# Altium footprint library Pasivos.PcbLib: 138 footprints (part 1 of 9)
Each footprint in its own frame and in the unit in brackets; x right, y up, seen from the top. Pads: shape width x height; smd on the part's side, far side on the other; paste and mask are expansions set on the pad; w line width, h text height; cw(c..) or ccw(c..) is an arc to the next point about the centre after c.
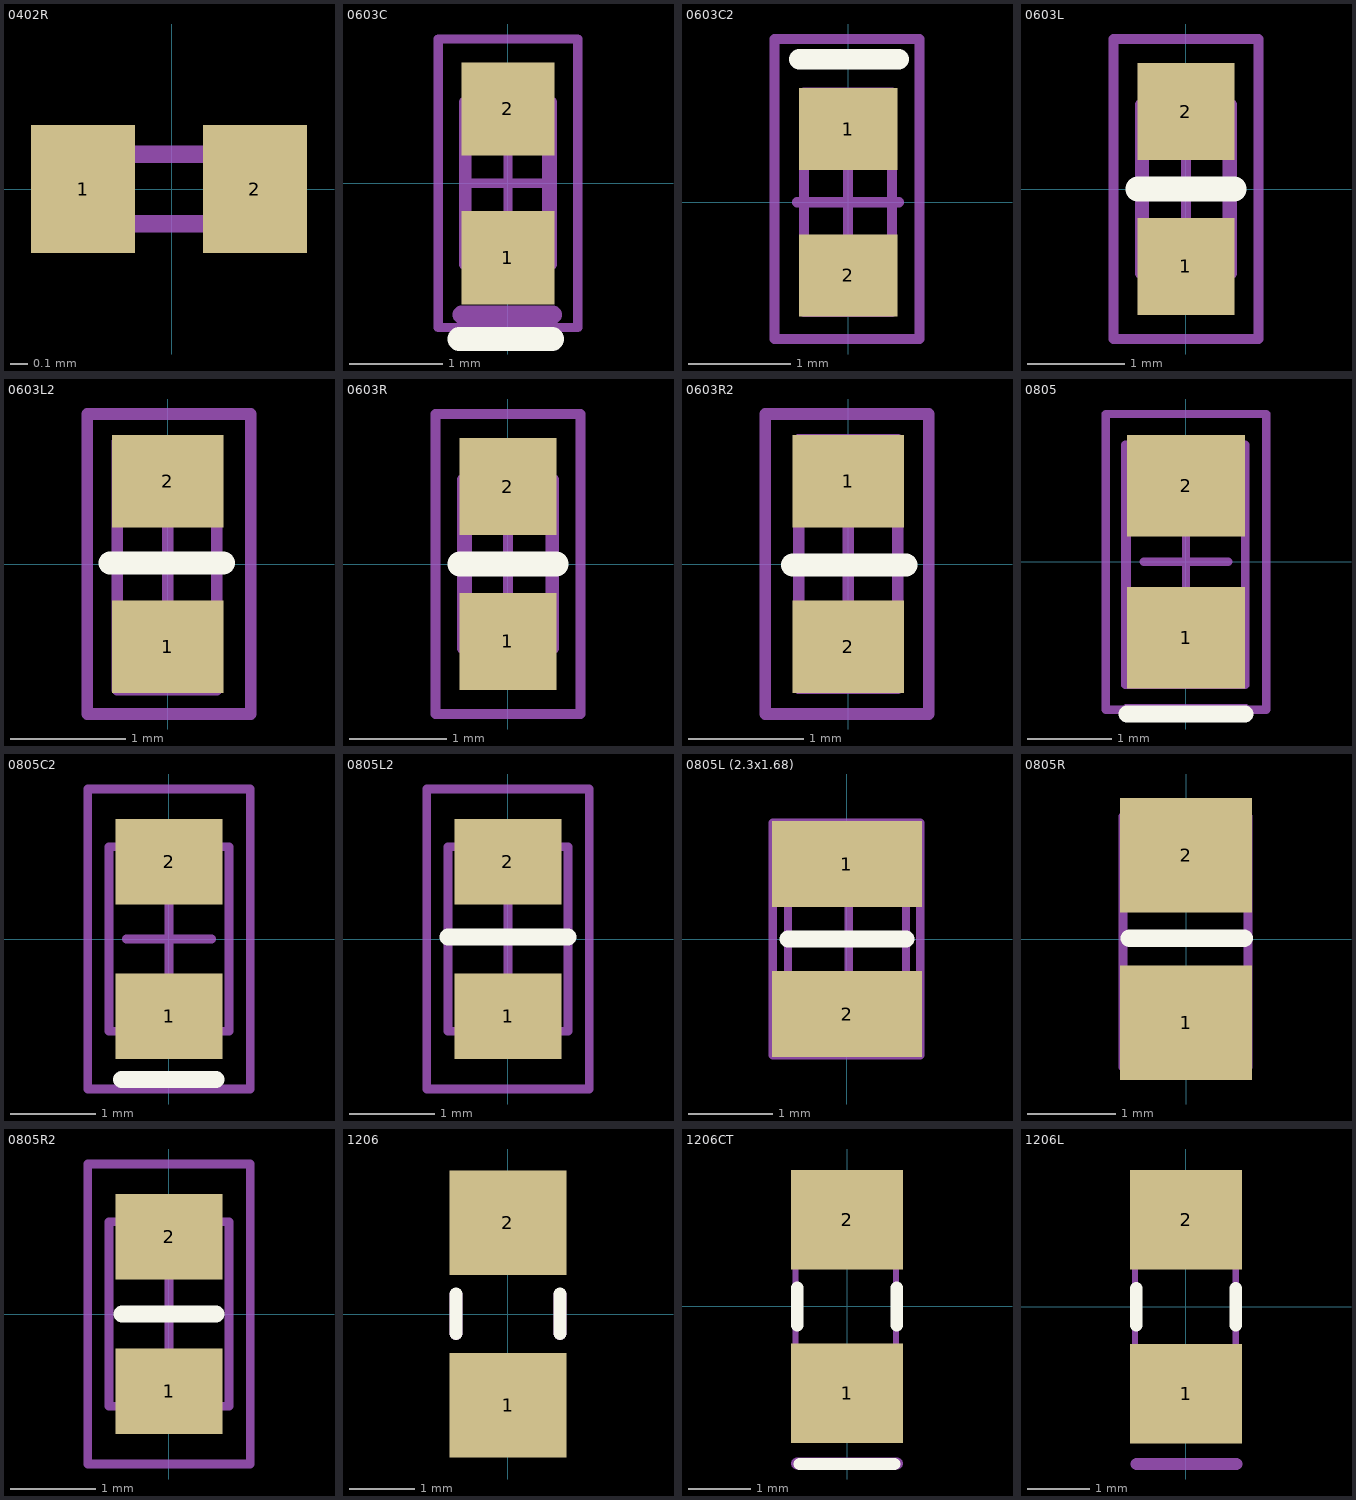
[diagram p0: the footprints below, top view; thin cyan lines are the x and y axes]

## 0402R [mm]
pads (2):
  rect 0.6x0.74 smd: 1(-0.51,0) 2(0.48,0)
Mechanical 16:
  rectangle: 0.225,-0.25 0.5,0.25
  rectangle: -0.501,-0.25 -0.226,0.25
  lines w0.102: -0.425,-0.2 0.425,-0.2 ; -0.425,0.2 0.425,0.2
3D body "0402R.step": height 0.34, standoff 0, extent -0.54,-0.3 0.5,0.3

## 0603C [mm]
pads (2):
  rect 1x1 smd: 1(0,-0.8) 2(0,0.8)
Top Overlay:
  lines w0.254: -0.524,-1.673 0.476,-1.673
Mechanical 13:
  lines w0.1: -0.475,-0.875 -0.475,0.875 0.475,0.875 0.475,-0.875 -0.475,-0.875
Mechanical 15:
  lines w0.1: -0.475,0 0.475,0 ; 0,-0.475 0,0.475 ; -0.75,-1.55 -0.75,1.55 0.75,1.55 0.75,-1.55 -0.75,-1.55
Mechanical 29:
  lines w0.1: -0.442,-1.076 -0.442,1.074 0.418,1.074 0.418,-1.076 -0.442,-1.076
  lines w0.2: -0.498,-1.411 0.482,-1.411
  text "'.Designator'" at 0.255,-0.949 h0.5
3D body "0603 SMD Capacitor.step": height 0.3, standoff 0, extent -0.4,-0.8 0.4,0.8

## 0603C2 [mm]
pads (2):
  rect 0.965x0.8 smd: 1(0,0.717) 2(0,-0.717)
Top Overlay:
  lines w0.2: -0.48,1.4 0.5,1.4
Mechanical 13:
  lines w0.1: -0.43,-1.075 -0.43,1.075 0.43,1.075 0.43,-1.075 -0.43,-1.075
Mechanical 15:
  lines w0.1: -0.5,0 0.5,0 ; 0,-0.5 0,0.5 ; -0.72,-1.34 0.7,-1.34 0.7,1.6 -0.72,1.6 -0.72,-1.34
3D body "0603 SMD Capacitor.step": height 0.3, standoff 0, extent -0.39,-0.8 0.41,0.8

## 0603L [mm] "1.60mm x 0.80mm"
pads (2):
  rect 1x1 smd: 1(0,-0.8) 2(0,0.8)
Top Overlay:
  lines w0.254: -0.5,0 0.5,0
Mechanical 13:
  lines w0.1: -0.475,-0.875 0.475,-0.875 0.475,0.875 -0.475,0.875 -0.475,-0.875
Mechanical 15:
  lines w0.1: -0.475,0 0.475,0 ; 0,-0.475 0,0.475 ; -0.75,-1.55 0.75,-1.55 0.75,1.55 -0.75,1.55 -0.75,-1.55
Mechanical 29:
  lines w0.1: -0.434,-1.075 0.426,-1.075 0.426,1.075 -0.434,1.075 -0.434,-1.075
  text "'.Designator'" at 0.291,-0.903 h0.5
3D body "0603L.step": height 0.78, standoff -0.01, extent -0.475,-0.8 0.475,0.8

## 0603L2 [mm] "1.60mm x 0.80mm"
pads (2):
  rect 0.965x0.8 smd: 1(0,-0.717) 2(0,0.718)
Top Overlay:
  lines w0.2: -0.5,0.01 0.48,0.01
Mechanical 13:
  lines w0.1: -0.437,-1.09 0.423,-1.09 0.423,1.06 -0.437,1.06 -0.437,-1.09
Mechanical 15:
  lines w0.1: -0.5,0 0.5,0 ; 0,-0.5 0,0.5 ; -0.7,-1.3 -0.7,1.3 0.72,1.3 0.72,-1.3 -0.7,-1.3
3D body "0603L.step": height 0.78, standoff -0.01, extent -0.47,-0.79 0.48,0.81

## 0603R [mm] "1.60mm x 0.80mm"
pads (2):
  rect 1x1 smd: 1(0,-0.8) 2(0,0.8)
Top Overlay:
  lines w0.254: -0.5,0 0.5,0
Mechanical 13:
  lines w0.1: -0.475,-0.875 0.475,-0.875 0.475,0.875 -0.475,0.875 -0.475,-0.875
Mechanical 15:
  lines w0.1: -0.475,0 0.475,0 ; 0,-0.475 0,0.475 ; -0.75,-1.55 0.75,-1.55 0.75,1.55 -0.75,1.55 -0.75,-1.55
Mechanical 29:
  lines w0.1: -0.424,-1.086 0.436,-1.086 0.436,1.064 -0.424,1.064 -0.424,-1.086
  text "'.Designator'" at 0.279,-0.908 h0.5
3D body "RES0603.STEP": height 0.45, standoff -0.01, extent -0.4,-0.8 0.4,0.8

## 0603R2 [mm] "1.60mm x 0.80mm"
pads (2):
  rect 0.965x0.8 smd: 1(0,0.718) 2(0,-0.717)
Top Overlay:
  lines w0.2: -0.48,-0.01 0.5,-0.01
Mechanical 13:
  lines w0.1: -0.43,-1.075 0.43,-1.075 0.43,1.075 -0.43,1.075 -0.43,-1.075
Mechanical 15:
  lines w0.1: -0.191,-0.022 0.157,-0.022 ; 0,-0.5 0,0.5 ; -0.72,-1.3 0.7,-1.3 0.7,1.3 -0.72,1.3 -0.72,-1.3
3D body "RES0603.STEP": height 0.45, standoff -0.01, extent -0.38,-0.82 0.42,0.78

## 0805 [mm]
pads (2):
  rect 1.4x1.2 smd: 1(0,-0.9) 2(0,0.9)
Top Overlay:
  lines w0.2: -0.7,-1.8 0.7,-1.8
Mechanical 13:
  lines w0.1: -0.7,-1.075 0.7,-1.075 0.7,1.075 -0.7,1.075 -0.7,-1.075
Mechanical 15:
  lines w0.1: -0.5,0 0.5,0 ; 0,-0.5 0,0.5 ; -0.95,-1.75 0.95,-1.75 0.95,1.75 -0.95,1.75 -0.95,-1.75
Mechanical 29:
  lines w0.1: -0.706,-1.729 0.71,-1.729 ; -0.716,-1.457 0.699,-1.457 0.699,1.385 -0.716,1.385 -0.716,-1.457
3D body "0805.step": height 0.43, standoff -0.03, extent -0.63,-0.9 0.63,1.1

## 0805C2 [mm]
pads (2):
  rect 1.25x1 smd: 1(0,-0.9) 2(0,0.9)
Top Overlay:
  lines w0.2: -0.55,-1.64 0.546,-1.64
Mechanical 13:
  lines w0.1: -0.7,-1.075 -0.7,1.075 0.7,1.075 0.7,-1.075 -0.7,-1.075
Mechanical 15:
  lines w0.1: -0.5,0 0.5,0 ; 0,-0.5 0,0.5 ; -0.95,-1.75 -0.95,1.75 0.95,1.75 0.95,-1.75 -0.95,-1.75
3D body "0805.step": height 0.43, standoff -0.03, extent -0.632,-0.941 0.628,1.059

## 0805L2 [mm]
pads (2):
  rect 1.25x1 smd: 1(0,-0.9) 2(0,0.9)
Top Overlay:
  lines w0.2: -0.699,0.023 0.701,0.023
Mechanical 13:
  lines w0.1: -0.7,-1.075 -0.7,1.075 0.7,1.075 0.7,-1.075 -0.7,-1.075
Mechanical 15:
  lines w0.1: -0.5,0 0.5,0 ; 0,-0.5 0,0.5 ; -0.95,-1.75 -0.95,1.75 0.95,1.75 0.95,-1.75 -0.95,-1.75
3D body "0805L.step": height 0.87, standoff -0.08, extent -0.606,-0.981 0.594,1.019
3D body: height 0.25, standoff 0, extent 0.727,-0.873 0.727,-0.873
3D body: height 0.25, standoff 0, extent -0.593,0.237 -0.593,0.237

## 0805L (2.3x1.68) [mm] "LQW2BASR56J00L Murata"
pads (2):
  rect 1.78x1.02 smd: 1(0,0.89) 2(0,-0.89)
Top Overlay:
  lines w0.2: -0.699,0.002 0.701,0.002
Mechanical 13:
  lines w0.1: -0.7,-0.885 0.7,-0.885 0.7,1.265 -0.7,1.265 -0.7,-0.885
Mechanical 15:
  lines w0.1: -0.501,-0.006 0.499,-0.006 ; 0.02,-0.522 0.02,0.478 ; -0.883,-1.379 0.87,-1.379 0.87,1.382 -0.883,1.382 -0.883,-1.379
3D body: height 0.25, standoff 0, extent 0.593,-0.047 0.593,-0.047
3D body: height 0.25, standoff 0, extent -0.727,1.063 -0.727,1.063
3D body "0805L.step": height 0.87, standoff -0.08, extent -0.622,-0.925 0.578,1.075

## 0805R [mm]
pads (2):
  rect 1.5x1.3 smd: 1(0,-0.95) 2(0,0.95)
Top Overlay:
  lines w0.2: -0.64,0.01 0.66,0.01
Mechanical 29:
  lines w0.1: -0.713,-1.453 0.703,-1.453 0.703,1.388 -0.713,1.388 -0.713,-1.453
3D body "0805R.step": height 0.45, standoff 0, extent -0.615,-0.95 0.635,1.05

## 0805R2 [mm]
pads (2):
  rect 1.25x1 smd: 1(0,-0.9) 2(0,0.9)
Top Overlay:
  lines w0.2: -0.549,0.001 0.548,0.001
Mechanical 13:
  lines w0.1: -0.7,-1.075 0.7,-1.075 0.7,1.075 -0.7,1.075 -0.7,-1.075
Mechanical 15:
  lines w0.1: -0.5,0 0.5,0 ; 0,-0.5 0,0.5 ; -0.95,-1.75 0.95,-1.75 0.95,1.75 -0.95,1.75 -0.95,-1.75
3D body "0805R.step": height 0.38, standoff -0.07, extent -0.633,-1.025 0.617,0.975

## 1206 [mm]
pads (2):
  rect 1.8x1.6 smd: 1(0,-1.4) 2(0,1.4)
Top Overlay:
  lines w0.2: -0.8,-0.296 -0.8,0.304 ; 0.8,-0.296 0.8,0.304
Mechanical 29:
  lines w0.2: -0.8,-0.3 -0.8,0.3 ; 0.8,-0.3 0.8,0.3
  text "'.Designator'" at 0.304,-2.063 h0.5
3D body "1206.step": height 0.53, standoff -0.03, extent -0.845,-1.589 0.815,1.611

## 1206CT [mm] "Capacitor Tantalio 1206"
pads (2):
  rect 1.8x1.6 smd: 1(0,-1.4) 2(0,1.4)
Top Overlay:
  lines w0.2: -0.8,-0.3 -0.8,0.3 ; -0.762,-2.543 0.762,-2.543 ; 0.8,-0.3 0.8,0.3
Mechanical 29:
  lines w0.1: -0.833,-2.136 0.792,-2.136 0.792,2.107 -0.833,2.107 -0.833,-2.136
  lines w0.2: -0.8,-2.536 0.8,-2.536
  text "'.Designator'" at 0.211,-1.88 h0.5
3D body "1206 SMD Capacitor.step": height 1, standoff 0, extent -0.838,-1.603 0.762,1.597

## 1206L [mm]
pads (2):
  rect 1.8x1.6 smd: 1(0,-1.4) 2(0,1.4)
Top Overlay:
  lines w0.2: -0.8,-0.3 -0.8,0.3 ; 0.8,-0.3 0.8,0.3
Mechanical 29:
  lines w0.1: -0.823,-2.134 -0.823,2.109 0.801,2.109 0.801,-2.134 -0.823,-2.134
  lines w0.2: -0.79,-2.534 0.81,-2.534
  text "'.Designator'" at 0.221,-1.878 h0.5
3D body "1206L.step": height 0.6, standoff 0, extent -0.762,-1.603 0.838,1.597